# Altium footprint library CPU.PcbLib: 56 footprints (part 4 of 4)
Each footprint in its own frame and in the unit in brackets; x right, y up, seen from the top. Pads: shape width x height; smd on the part's side, far side on the other; paste and mask are expansions set on the pad; w line width, h text height; cw(c..) or ccw(c..) is an arc to the next point about the centre after c.
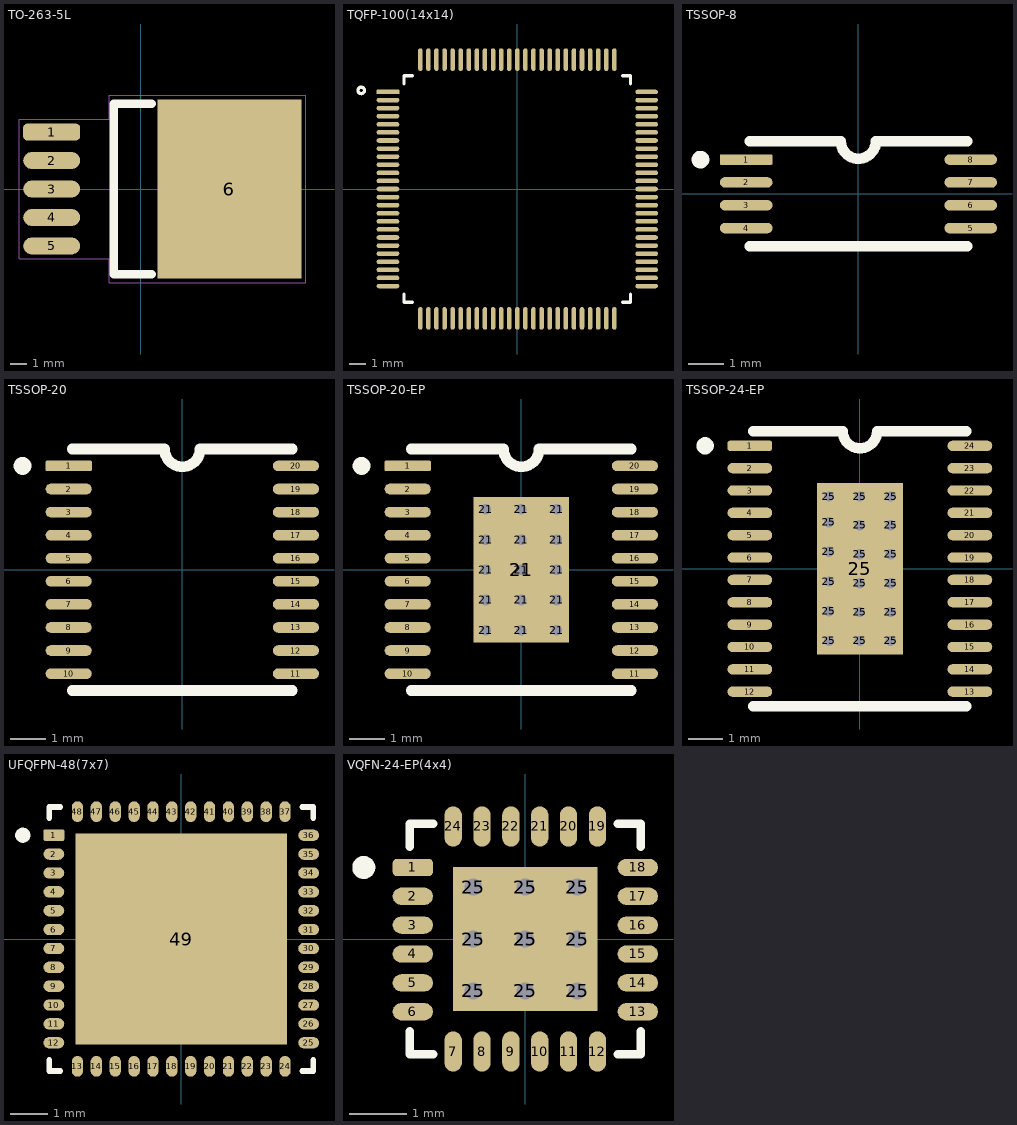
[diagram p3: the footprints below, top view; thin cyan lines are the x and y axes]

## TO-263-5L [mm]
pads (6):
  rrect50% 3.4x1 smd paste-0.05 mask+0.15: 1(-5.3,3.4)
  oval 3.4x1 smd paste-0.05 mask+0.15: 2(-5.3,1.7) 3(-5.3,0) 4(-5.3,-1.7) 5(-5.3,-3.4)
  rect 8.6x10.7 smd paste-0.05 mask+0.07: 6(5.3,0)
Top Overlay:
  lines w0.5: 0.68,-5.08 -1.605,-5.08 -1.605,5.08 0.68,5.08
Mechanical 15:
  lines w0.05: -7.25,-4.15 -1.855,-4.15 -1.855,-5.6 9.85,-5.6 9.85,5.6 -1.855,5.6 -1.855,4.15 -7.25,4.15 -7.25,-4.15
3D body "step_temp.STEP": height 4.65, standoff -0.15, extent -6.175,-5.08 8.176,5.08

## TQFP-100(14x14) [mm]
height 1.2
pads (100):
  rrect25% 1.4x0.28 smd: 1(-8,6)
  oval 1.4x0.28 smd: 2(-8,5.5) 3(-8,5) 4(-8,4.5) 5(-8,4) 6(-8,3.5) 7(-8,3) 8(-8,2.5) 9(-8,2) 10(-8,1.5) 11(-8,1) 12(-8,0.5) 13(-8,0) 14(-8,-0.5) 15(-8,-1) 16(-8,-1.5) 17(-8,-2) 18(-8,-2.5) 19(-8,-3) 20(-8,-3.5) 21(-8,-4) 22(-8,-4.5) 23(-8,-5) 24(-8,-5.5) 25(-8,-6) 51(8,-6) 52(8,-5.5) 53(8,-5) 54(8,-4.5) 55(8,-4) 56(8,-3.5) 57(8,-3) 58(8,-2.5) 59(8,-2) 60(8,-1.5) 61(8,-1) 62(8,-0.5) 63(8,0) 64(8,0.5) 65(8,1) 66(8,1.5) 67(8,2) 68(8,2.5) 69(8,3) 70(8,3.5) 71(8,4) 72(8,4.5) 73(8,5) 74(8,5.5) 75(8,6)
  oval 0.28x1.4 smd: 26(-6,-8) 27(-5.5,-8) 28(-5,-8) 29(-4.5,-8) 30(-4,-8) 31(-3.5,-8) 32(-3,-8) 33(-2.5,-8) 34(-2,-8) 35(-1.5,-8) 36(-1,-8) 37(-0.5,-8) 38(0,-8) 39(0.5,-8) 40(1,-8) 41(1.5,-8) 42(2,-8) 43(2.5,-8) 44(3,-8) 45(3.5,-8) 46(4,-8) 47(4.5,-8) 48(5,-8) 49(5.5,-8) 50(6,-8) 76(6,8) 77(5.5,8) 78(5,8) 79(4.5,8) 80(4,8) 81(3.5,8) 82(3,8) 83(2.5,8) 84(2,8) 85(1.5,8) 86(1,8) 87(0.5,8) 88(0,8) 89(-0.5,8) 90(-1,8) 91(-1.5,8) 92(-2,8) 93(-2.5,8) 94(-3,8) 95(-3.5,8) 96(-4,8) 97(-4.5,8) 98(-5,8) 99(-5.5,8) 100(-6,8)
Top Overlay:
  circle w0.2: c-9.652,6.096 r0.2
  lines w0.2: -7,-6.5 -7,-7 -6.5,-7 ; -7,6.5 -7,7 -6.5,7 ; 6.5,-7 7,-7 7,-6.5 ; 6.5,7 7,7 7,6.5
3D body "ATMEGA2560-16AU--3DModel-STEP-56544.STEP": height 1.2, standoff 0, extent -8,-8 8,8

## TSSOP-8 [mm]
pads (8):
  rrect25% 1.5x0.3 smd: 1(-3.2,0.975)
  oval 1.5x0.3 smd: 2(-3.2,0.325) 3(-3.2,-0.325) 4(-3.2,-0.975) 5(3.2,-0.975) 6(3.2,-0.325) 7(3.2,0.325) 8(3.2,0.975)
Top Overlay:
  circle w0.3: c-4.5,0.975 r0.1
  lines w0.3: -3.1,-1.5 3.1,-1.5 ; -3.1,1.5 -0.5,1.5 ccw(c0,1.5) 0.5,1.5 3.1,1.5
3D body "step_temp.STEP": height 1.2, standoff 0, extent -3.2,-1.5 3.2,1.5

## TSSOP-20 [mm]
pads (20):
  rrect25% 1.3x0.3 smd: 1(-3.2,2.925)
  oval 1.3x0.3 smd: 2(-3.2,2.275) 3(-3.2,1.625) 4(-3.2,0.975) 5(-3.2,0.325) 6(-3.2,-0.325) 7(-3.2,-0.975) 8(-3.2,-1.625) 9(-3.2,-2.275) 10(-3.2,-2.925) 11(3.2,-2.925) 12(3.2,-2.275) 13(3.2,-1.625) 14(3.2,-0.975) 15(3.2,-0.325) 16(3.2,0.325) 17(3.2,0.975) 18(3.2,1.625) 19(3.2,2.275) 20(3.2,2.925)
Top Overlay:
  circle w0.3: c-4.5,2.925 r0.1
  lines w0.3: -3.1,-3.4 3.1,-3.4 ; -3.1,3.4 -0.5,3.4 ccw(c0,3.4) 0.5,3.4 3.1,3.4
3D body "step_temp.STEP": height 1.1, standoff 0, extent -3.2,-3.25 3.2,3.25

## TSSOP-20-EP [mm]
pads (36):
  rrect25% 1.3x0.3 smd: 1(-3.2,2.925)
  oval 1.3x0.3 smd: 2(-3.2,2.275) 3(-3.2,1.625) 4(-3.2,0.975) 5(-3.2,0.325) 6(-3.2,-0.325) 7(-3.2,-0.975) 8(-3.2,-1.625) 9(-3.2,-2.275) 10(-3.2,-2.925) 11(3.2,-2.925) 12(3.2,-2.275) 13(3.2,-1.625) 14(3.2,-0.975) 15(3.2,-0.325) 16(3.2,0.325) 17(3.2,0.975) 18(3.2,1.625) 19(3.2,2.275) 20(3.2,2.925)
  round 0.5 hole 0.3: 21(-1,-1.7) 21(-1,-0.85) 21(-1,0) 21(-1,0.85) 21(-1,1.7) 21(0,-1.7) 21(0,-0.85) 21(0,0) 21(0,0.85) 21(0,1.7) 21(1,-1.7) 21(1,-0.85) 21(1,0) 21(1,0.85) 21(1,1.7)
  rect 2.7x4.1 smd paste-3: 21(0,0)
Top Overlay:
  circle w0.3: c-4.5,2.925 r0.1
  lines w0.3: -3.1,-3.4 3.1,-3.4 ; -3.1,3.4 -0.5,3.4 ccw(c0,3.4) 0.5,3.4 3.1,3.4
Top Paste:
  region: 0.867,-1.245 -0.867,-1.245 -0.867,1.245 0.867,1.245
3D body "step_temp.STEP": height 1.1, standoff 0, extent -3.2,-3.25 3.2,3.25

## TSSOP-24-EP [mm]
pads (43):
  rrect50% 1.3x0.3 smd: 1(-3.2,3.575)
  oval 1.3x0.3 smd: 2(-3.2,2.925) 3(-3.2,2.275) 4(-3.2,1.625) 5(-3.2,0.975) 6(-3.2,0.325) 7(-3.2,-0.325) 8(-3.2,-0.975) 9(-3.2,-1.625) 10(-3.2,-2.275) 11(-3.2,-2.925) 12(-3.2,-3.575) 13(3.2,-3.575) 14(3.2,-2.925) 15(3.2,-2.275) 16(3.2,-1.625) 17(3.2,-0.972) 18(3.2,-0.325) 19(3.2,0.325) 20(3.2,0.975) 21(3.2,1.625) 22(3.2,2.275) 23(3.2,2.925) 24(3.2,3.575)
  round 0.5 hole 0.3: 25(-0.9,-2.1) 25(-0.9,-1.236) 25(-0.9,-0.373) 25(-0.9,0.491) 25(-0.9,1.355) 25(-0.9,2.1) 25(0,-2.1) 25(0,-1.26) 25(0,-0.42) 25(0,0.42) 25(0,1.26) 25(0,2.1) 25(0.9,-2.1) 25(0.9,-1.26) 25(0.9,-0.42) 25(0.9,0.42) 25(0.9,1.26) 25(0.9,2.1)
  rect 2.5x5 smd: 25(0,0)
Top Overlay:
  circle w0.3: c-4.5,3.575 r0.1
  lines w0.3: -3.1,-4 3.1,-4 ; -3.1,4 -0.5,4 ccw(c0,4) 0.5,4 3.1,4
3D body "TSSOP-24.step": height 0.93, standoff 0.01, extent -3.203,-3.95 3.203,3.95

## UFQFPN-48(7x7) [mm]
pads (49):
  rrect25% 0.55x0.3 smd: 1(-3.375,2.75)
  oval 0.55x0.3 smd: 2(-3.375,2.25) 3(-3.375,1.75) 4(-3.375,1.25) 5(-3.375,0.75) 6(-3.375,0.25) 7(-3.375,-0.25) 8(-3.375,-0.75) 9(-3.375,-1.25) 10(-3.375,-1.75) 11(-3.375,-2.25) 12(-3.375,-2.75) 25(3.375,-2.75) 26(3.375,-2.25) 27(3.375,-1.75) 28(3.375,-1.25) 29(3.375,-0.75) 30(3.375,-0.25) 31(3.375,0.25) 32(3.375,0.75) 33(3.375,1.25) 34(3.375,1.75) 35(3.375,2.25) 36(3.375,2.75)
  oval 0.3x0.55 smd: 13(-2.75,-3.375) 14(-2.25,-3.375) 15(-1.75,-3.375) 16(-1.25,-3.375) 17(-0.75,-3.375) 18(-0.25,-3.375) 19(0.25,-3.375) 20(0.75,-3.375) 21(1.25,-3.375) 22(1.75,-3.375) 23(2.25,-3.375) 24(2.75,-3.375) 37(2.75,3.375) 38(2.25,3.375) 39(1.75,3.375) 40(1.25,3.375) 41(0.75,3.375) 42(0.25,3.375) 43(-0.25,3.375) 44(-0.75,3.375) 45(-1.25,3.375) 46(-1.75,3.375) 47(-2.25,3.375) 48(-2.75,3.375)
  rect 5.6x5.6 smd paste-4: 49(0,0)
Top Overlay:
  circle w0.2: c-4.2,2.75 r0.1
  lines w0.15: -3.5,-3.205 -3.5,-3.5 -3.205,-3.5 ; -3.5,3.205 -3.5,3.5 -3.205,3.5 ; 3.205,-3.5 3.5,-3.5 3.5,-3.205 ; 3.205,3.5 3.5,3.5 3.5,3.205
Top Paste:
  region: 2.29,-2.29 0.51,-2.29 0.51,-0.51 2.29,-0.51
  region: -0.51,-2.29 -2.29,-2.29 -2.29,-0.51 -0.51,-0.51
  region: 2.29,0.51 0.51,0.51 0.51,2.29 2.29,2.29
  region: -0.51,0.51 -2.29,0.51 -2.29,2.29 -0.51,2.29
3D body "STM32F411CEU6--3DModel-STEP-56544.STEP": height 0.6, standoff 0, extent -3.5,-3.5 3.5,3.5

## VQFN-24-EP(4x4) [mm]
pads (34):
  rrect50% 0.7x0.3 smd mask+0.05: 1(-1.95,1.24)
  oval 0.7x0.3 smd mask+0.05: 2(-1.95,0.74) 3(-1.95,0.24) 4(-1.95,-0.26) 5(-1.95,-0.76) 6(-1.95,-1.26) 13(1.95,-1.26) 14(1.95,-0.76) 15(1.95,-0.26) 16(1.95,0.24) 17(1.95,0.74) 18(1.95,1.24)
  oval 0.3x0.7 smd mask+0.05: 7(-1.25,-1.95) 8(-0.75,-1.95) 9(-0.25,-1.95) 10(0.25,-1.95) 11(0.75,-1.95) 12(1.25,-1.95) 19(1.25,1.95) 20(0.75,1.95) 21(0.25,1.95) 22(-0.25,1.95) 23(-0.75,1.95) 24(-1.25,1.95)
  round 0.5 hole 0.3: 25(-0.9,-0.9) 25(-0.9,0) 25(-0.9,0.9) 25(0,-0.9) 25(0,0) 25(0,0.9) 25(0.9,-0.9) 25(0.9,0) 25(0.9,0.9)
  rect 2.5x2.5 smd mask+0.05: 25(0,0)
Top Overlay:
  circle w0.2: c-2.8,1.24 r0.1
  lines w0.15: -2,-1.6 -2,-2 -1.6,-2 ; -2,1.6 -2,2 -1.6,2 ; 1.6,-2 2,-2 2,-1.6 ; 1.6,2 2,2 2,1.6
3D body "TPS650531RGER.STEP": height 1, standoff 0, extent -2,-2 2,2